# Altium footprint library Connectors.PcbLib: 67 footprints (part 3 of 5)
Each footprint in its own frame and in the unit in brackets; x right, y up, seen from the top. Pads: shape width x height; smd on the part's side, far side on the other; paste and mask are expansions set on the pad; w line width, h text height; cw(c..) or ccw(c..) is an arc to the next point about the centre after c.
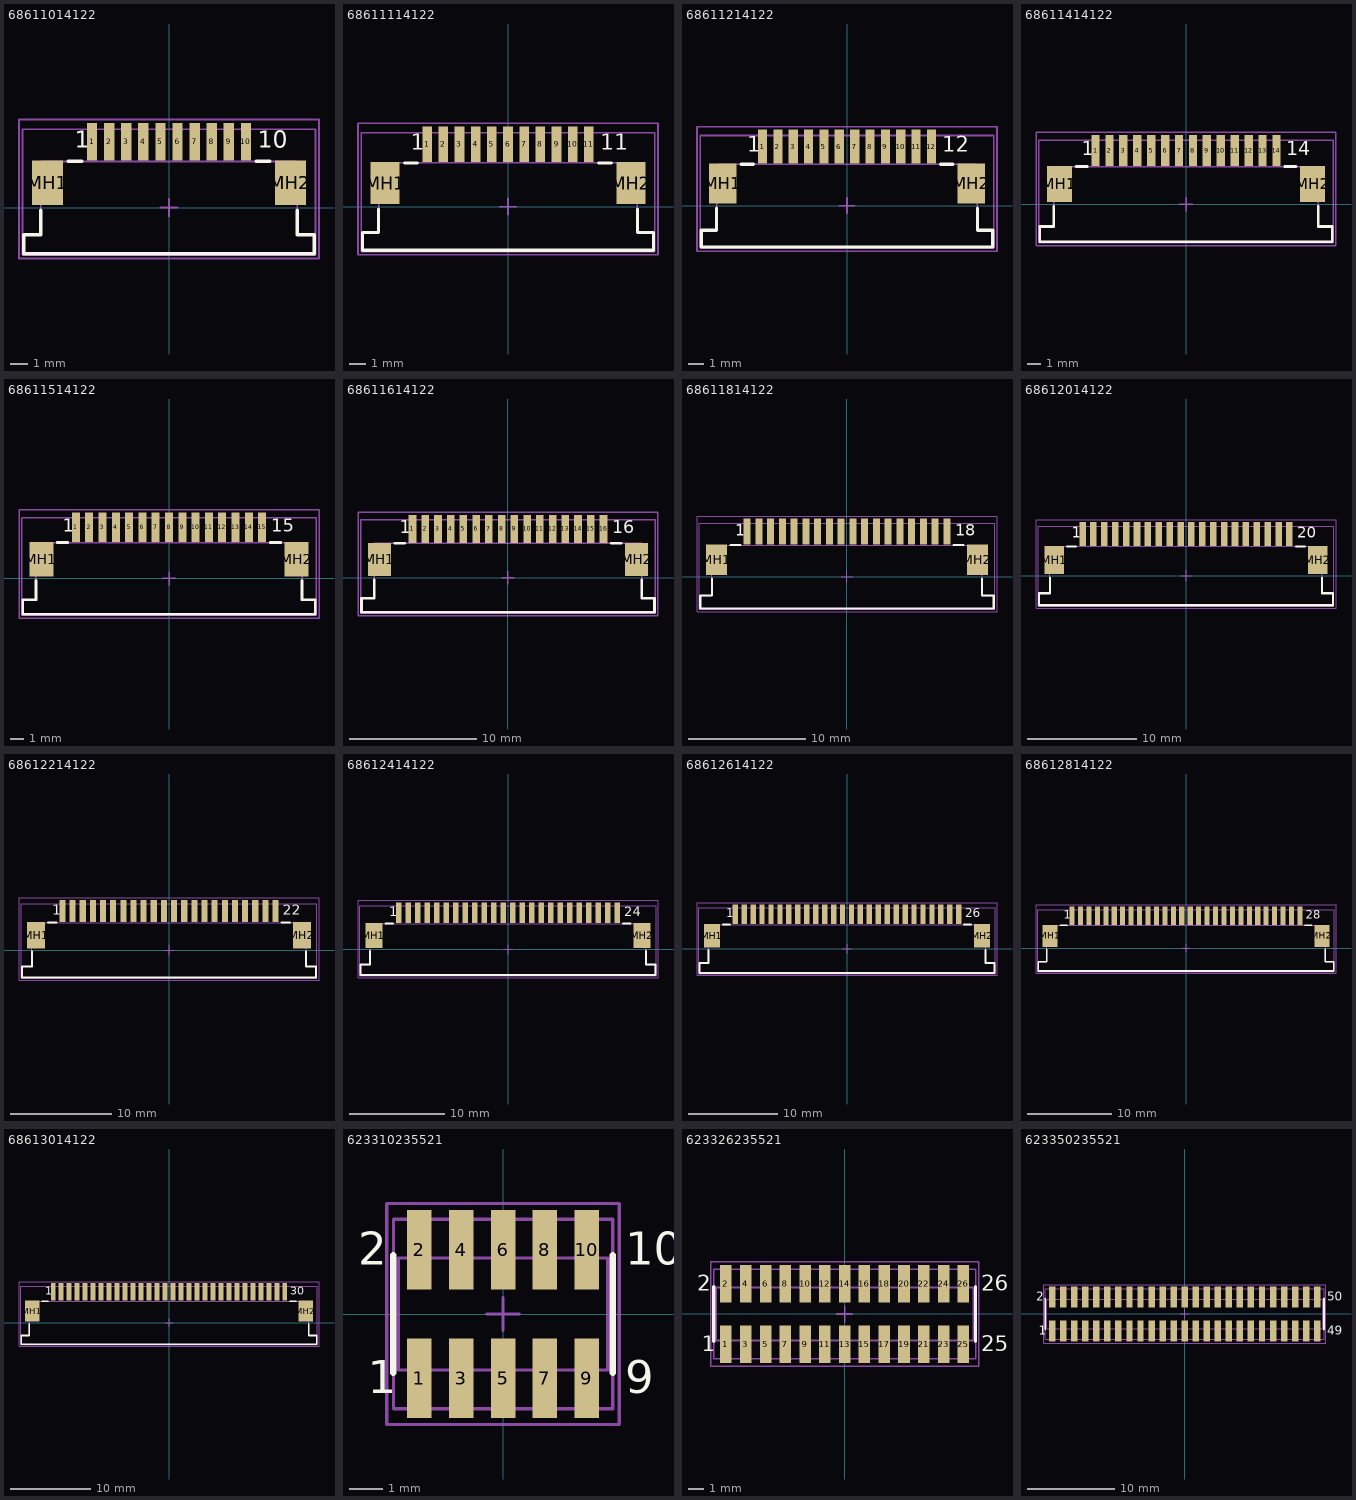
[diagram p2: the footprints below, top view; thin cyan lines are the x and y axes]

## 68611014122 [mm] "ZIF Connectors, Horizontal, Top Contact, pitch 1mm, 10p"
height 3.15
pads (12):
  rect 0.6x2.2 smd: 1(-4.5,3.85) 2(-3.5,3.85) 3(-2.5,3.85) 4(-1.5,3.85) 5(-0.5,3.85) 6(0.5,3.85) 7(1.5,3.85) 8(2.5,3.85) 9(3.5,3.85) 10(4.5,3.85)
  rect 1.8x2.6 smd: MH1(-7.1,1.45) MH2(7.1,1.45)
Top Overlay:
  lines w0.2: -7.5,-0.15 -7.5,-1.6 -8.5,-1.6 -8.5,-2.7 8.5,-2.7 8.5,-1.6 7.5,-1.6 7.5,-0.15 ; -5.9,2.7 -5.1,2.7 ; 5.1,2.7 5.9,2.7
  text "10" at 5.2,3.5 h1
  text "1" at -5.5,3.5 h1
Mechanical 11:
  lines w0.1: -8.5,-2.7 8.5,-2.7 8.5,-1.6 7.5,-1.6 7.5,2.7 -7.5,2.7 -7.5,-1.6 -8.5,-1.6 -8.5,-2.7
Mechanical 13:
  lines w0.1: -8.575,-2.775 -8.575,4.575 8.575,4.575 8.575,-2.775 -8.575,-2.775
Mechanical 15:
  lines w0.1: -0.5,0 0.5,0 ; 0,-0.5 0,0.5 ; -8.775,-2.975 8.775,-2.975 8.775,5.15 -8.775,5.15 -8.775,-2.975
3D body "68611014122.stp": height 3.02, standoff 0.02, extent -8.5,-2.7 8.5,4.4

## 68611114122 [mm] "ZIF Connectors, Horizontal, Top Contact, pitch 1mm, 11p"
height 3.15
pads (13):
  rect 0.6x2.2 smd: 1(-5,3.85) 2(-4,3.85) 3(-3,3.85) 4(-2,3.85) 5(-1,3.85) 6(0,3.85) 7(1,3.85) 8(2,3.85) 9(3,3.85) 10(4,3.85) 11(5,3.85)
  rect 1.8x2.6 smd: MH1(-7.6,1.45) MH2(7.6,1.45)
Top Overlay:
  lines w0.2: -8,-0.15 -8,-1.6 -9,-1.6 -9,-2.7 9,-2.7 9,-1.6 8,-1.6 8,-0.15 ; -6.4,2.7 -5.6,2.7 ; 5.6,2.7 6.4,2.7
  text "1" at -6,3.5 h1
  text "11" at 5.7,3.5 h1
Mechanical 11:
  lines w0.1: -9,-2.7 -9,-1.6 -8,-1.6 -8,2.7 8,2.7 8,-1.6 9,-1.6 9,-2.7 -9,-2.7
Mechanical 13:
  lines w0.1: -9.075,-2.775 9.075,-2.775 9.075,4.575 -9.075,4.575 -9.075,-2.775
Mechanical 15:
  lines w0.1: -0.5,0 0.5,0 ; 0,-0.5 0,0.5 ; -9.275,-2.975 -9.275,5.15 9.275,5.15 9.275,-2.975 -9.275,-2.975
3D body "68611114122.stp": height 3.02, standoff 0.02, extent -9,-2.7 9,4.4

## 68611214122 [mm] "ZIF Connectors, Horizontal, Top Contact, pitch 1mm, 12p"
height 3.15
pads (14):
  rect 0.6x2.2 smd: 1(-5.5,3.85) 2(-4.5,3.85) 3(-3.5,3.85) 4(-2.5,3.85) 5(-1.5,3.85) 6(-0.5,3.85) 7(0.5,3.85) 8(1.5,3.85) 9(2.5,3.85) 10(3.5,3.85) 11(4.5,3.85) 12(5.5,3.85)
  rect 1.8x2.6 smd: MH1(-8.1,1.45) MH2(8.1,1.45)
Top Overlay:
  lines w0.2: -8.5,-0.15 -8.5,-1.6 -9.5,-1.6 -9.5,-2.7 9.5,-2.7 9.5,-1.6 8.5,-1.6 8.5,-0.15 ; -6.9,2.7 -6.1,2.7 ; 6.1,2.7 6.9,2.7
  text "1" at -6.5,3.5 h1
  text "12" at 6.2,3.5 h1
Mechanical 11:
  lines w0.1: -9.5,-2.7 -9.5,-1.6 -8.5,-1.6 -8.5,2.7 8.5,2.7 8.5,-1.6 9.5,-1.6 9.5,-2.7 -9.5,-2.7
Mechanical 13:
  lines w0.1: -9.575,-2.775 9.575,-2.775 9.575,4.575 -9.575,4.575 -9.575,-2.775
Mechanical 15:
  lines w0.1: -0.5,0 0.5,0 ; 0,-0.5 0,0.5 ; -9.775,-2.975 -9.775,5.15 9.775,5.15 9.775,-2.975 -9.775,-2.975
3D body "68611214122.stp": height 3.02, standoff 0.02, extent -9.5,-2.7 9.5,4.4

## 68611414122 [mm] "ZIF Connectors, Horizontal, Top Contact, pitch 1mm, 14p"
height 3.15
pads (16):
  rect 0.6x2.2 smd: 1(-6.5,3.85) 2(-5.5,3.85) 3(-4.5,3.85) 4(-3.5,3.85) 5(-2.5,3.85) 6(-1.5,3.85) 7(-0.5,3.85) 8(0.5,3.85) 9(1.5,3.85) 10(2.5,3.85) 11(3.5,3.85) 12(4.5,3.85) 13(5.5,3.85) 14(6.5,3.85)
  rect 1.8x2.6 smd: MH1(-9.1,1.45) MH2(9.1,1.45)
Top Overlay:
  lines w0.2: -9.5,-0.15 -9.5,-1.6 -10.5,-1.6 -10.5,-2.7 10.5,-2.7 10.5,-1.6 9.5,-1.6 9.5,-0.15 ; -7.9,2.7 -7.1,2.7 ; 7.1,2.7 7.9,2.7
  text "1" at -7.5,3.5 h1
  text "14" at 7.2,3.5 h1
Mechanical 11:
  lines w0.1: -10.5,-2.7 -10.5,-1.6 -9.5,-1.6 -9.5,2.7 9.5,2.7 9.5,-1.6 10.5,-1.6 10.5,-2.7 -10.5,-2.7
Mechanical 13:
  lines w0.1: -10.575,-2.775 10.575,-2.775 10.575,4.575 -10.575,4.575 -10.575,-2.775
Mechanical 15:
  lines w0.1: -0.5,0 0.5,0 ; 0,-0.5 0,0.5 ; -10.775,-2.975 -10.775,5.15 10.775,5.15 10.775,-2.975 -10.775,-2.975
3D body "68611414122.stp": height 3.02, standoff 0.02, extent -10.5,-2.7 10.5,4.4

## 68611514122 [mm] "ZIF Connectors, Horizontal, Top Contact, pitch 1mm, 15p"
height 3.15
pads (17):
  rect 0.6x2.2 smd: 1(-7,3.85) 2(-6,3.85) 3(-5,3.85) 4(-4,3.85) 5(-3,3.85) 6(-2,3.85) 7(-1,3.85) 8(0,3.85) 9(1,3.85) 10(2,3.85) 11(3,3.85) 12(4,3.85) 13(5,3.85) 14(6,3.85) 15(7,3.85)
  rect 1.8x2.6 smd: MH1(-9.6,1.45) MH2(9.6,1.45)
Top Overlay:
  lines w0.2: -10,-0.15 -10,-1.6 -11,-1.6 -11,-2.7 11,-2.7 11,-1.6 10,-1.6 10,-0.15 ; -8.4,2.7 -7.6,2.7 ; 7.6,2.7 8.4,2.7
  text "15" at 7.7,3.5 h1
  text "1" at -8,3.5 h1
Mechanical 11:
  lines w0.1: -11,-2.7 -11,-1.6 -10,-1.6 -10,2.7 10,2.7 10,-1.6 11,-1.6 11,-2.7 -11,-2.7
Mechanical 13:
  lines w0.1: -11.075,-2.775 11.075,-2.775 11.075,4.575 -11.075,4.575 -11.075,-2.775
Mechanical 15:
  lines w0.1: -0.5,0 0.5,0 ; 0,-0.5 0,0.5 ; -11.275,-2.975 -11.275,5.15 11.275,5.15 11.275,-2.975 -11.275,-2.975
3D body "68611514122.stp": height 3.02, standoff 0.02, extent -11,-2.7 11,4.4

## 68611614122 [mm] "ZIF Connectors, Horizontal, Top Contact, pitch 1mm, 16p"
height 3.15
pads (18):
  rect 0.6x2.2 smd: 1(-7.5,3.85) 2(-6.5,3.85) 3(-5.5,3.85) 4(-4.5,3.85) 5(-3.5,3.85) 6(-2.5,3.85) 7(-1.5,3.85) 8(-0.5,3.85) 9(0.5,3.85) 10(1.5,3.85) 11(2.5,3.85) 12(3.5,3.85) 13(4.5,3.85) 14(5.5,3.85) 15(6.5,3.85) 16(7.5,3.85)
  rect 1.8x2.6 smd: MH1(-10.1,1.45) MH2(10.1,1.45)
Top Overlay:
  lines w0.2: -10.5,-0.15 -10.5,-1.6 -11.5,-1.6 -11.5,-2.7 11.5,-2.7 11.5,-1.6 10.5,-1.6 10.5,-0.15 ; -8.9,2.7 -8.1,2.7 ; 8.1,2.7 8.9,2.7
  text "1" at -8.5,3.5 h1
  text "16" at 8.2,3.5 h1
Mechanical 11:
  lines w0.1: -11.5,-2.7 -11.5,-1.6 -10.5,-1.6 -10.5,2.7 10.5,2.7 10.5,-1.6 11.5,-1.6 11.5,-2.7 -11.5,-2.7
Mechanical 13:
  lines w0.1: -11.575,-2.775 11.575,-2.775 11.575,4.575 -11.575,4.575 -11.575,-2.775
Mechanical 15:
  lines w0.1: -0.5,0 0.5,0 ; 0,-0.5 0,0.5 ; -11.775,-2.975 -11.775,5.15 11.775,5.15 11.775,-2.975 -11.775,-2.975
3D body "68611614122.stp": height 3.02, standoff 0.02, extent -11.5,-2.7 11.5,4.4

## 68611814122 [mm] "ZIF Connectors, Horizontal, Top Contact, pitch 1mm, 18p"
height 3.15
pads (20):
  rect 0.6x2.2 smd: 1(-8.5,3.85) 2(-7.5,3.85) 3(-6.5,3.85) 4(-5.5,3.85) 5(-4.5,3.85) 6(-3.5,3.85) 7(-2.5,3.85) 8(-1.5,3.85) 9(-0.5,3.85) 10(0.5,3.85) 11(1.5,3.85) 12(2.5,3.85) 13(3.5,3.85) 14(4.5,3.85) 15(5.5,3.85) 16(6.5,3.85) 17(7.5,3.85) 18(8.5,3.85)
  rect 1.8x2.6 smd: MH1(-11.1,1.45) MH2(11.1,1.45)
Top Overlay:
  lines w0.2: -11.5,-0.15 -11.5,-1.6 -12.5,-1.6 -12.5,-2.7 12.5,-2.7 12.5,-1.6 11.5,-1.6 11.5,-0.15 ; -9.9,2.7 -9.1,2.7 ; 9.1,2.7 9.9,2.7
  text "1" at -9.5,3.5 h1
  text "18" at 9.2,3.5 h1
Mechanical 11:
  lines w0.1: -12.5,-2.7 -12.5,-1.6 -11.5,-1.6 -11.5,2.7 11.5,2.7 11.5,-1.6 12.5,-1.6 12.5,-2.7 -12.5,-2.7
Mechanical 13:
  lines w0.1: -12.575,-2.775 12.575,-2.775 12.575,4.575 -12.575,4.575 -12.575,-2.775
Mechanical 15:
  lines w0.1: -0.5,0 0.5,0 ; 0,-0.5 0,0.5 ; -12.775,-2.975 -12.775,5.15 12.775,5.15 12.775,-2.975 -12.775,-2.975
3D body "68611814122.stp": height 3.02, standoff 0.02, extent -12.5,-2.7 12.5,4.4

## 68612014122 [mm] "ZIF Connectors, Horizontal, Top Contact, pitch 1mm, 20p"
height 3.15
pads (22):
  rect 0.6x2.2 smd: 1(-9.5,3.85) 2(-8.5,3.85) 3(-7.5,3.85) 4(-6.5,3.85) 5(-5.5,3.85) 6(-4.5,3.85) 7(-3.5,3.85) 8(-2.5,3.85) 9(-1.5,3.85) 10(-0.5,3.85) 11(0.5,3.85) 12(1.5,3.85) 13(2.5,3.85) 14(3.5,3.85) 15(4.5,3.85) 16(5.5,3.85) 17(6.5,3.85) 18(7.5,3.85) 19(8.5,3.85) 20(9.5,3.85)
  rect 1.8x2.6 smd: MH1(-12.1,1.45) MH2(12.1,1.45)
Top Overlay:
  lines w0.2: -12.5,-0.15 -12.5,-1.6 -13.5,-1.6 -13.5,-2.7 13.5,-2.7 13.5,-1.6 12.5,-1.6 12.5,-0.15 ; -10.9,2.7 -10.1,2.7 ; 10.1,2.7 10.9,2.7
  text "1" at -10.5,3.5 h1
  text "20" at 10.2,3.5 h1
Mechanical 11:
  lines w0.1: -13.5,-2.7 -13.5,-1.6 -12.5,-1.6 -12.5,2.7 12.5,2.7 12.5,-1.6 13.5,-1.6 13.5,-2.7 -13.5,-2.7
Mechanical 13:
  lines w0.1: -13.575,-2.775 13.575,-2.775 13.575,4.575 -13.575,4.575 -13.575,-2.775
Mechanical 15:
  lines w0.1: -0.5,0 0.5,0 ; 0,-0.5 0,0.5 ; -13.775,-2.975 -13.775,5.15 13.775,5.15 13.775,-2.975 -13.775,-2.975
3D body "68612014122.stp": height 3.02, standoff 0.02, extent -13.5,-2.7 13.5,4.4

## 68612214122 [mm] "ZIF Connectors, Horizontal, Top Contact, pitch 1mm, 22p"
height 3.15
pads (24):
  rect 0.6x2.2 smd: 1(-10.5,3.85) 2(-9.5,3.85) 3(-8.5,3.85) 4(-7.5,3.85) 5(-6.5,3.85) 6(-5.5,3.85) 7(-4.5,3.85) 8(-3.5,3.85) 9(-2.5,3.85) 10(-1.5,3.85) 11(-0.5,3.85) 12(0.5,3.85) 13(1.5,3.85) 14(2.5,3.85) 15(3.5,3.85) 16(4.5,3.85) 17(5.5,3.85) 18(6.5,3.85) 19(7.5,3.85) 20(8.5,3.85) 21(9.5,3.85) 22(10.5,3.85)
  rect 1.8x2.6 smd: MH1(-13.1,1.45) MH2(13.1,1.45)
Top Overlay:
  lines w0.2: -13.5,-0.15 -13.5,-1.6 -14.5,-1.6 -14.5,-2.7 14.5,-2.7 14.5,-1.6 13.5,-1.6 13.5,-0.15 ; -11.9,2.7 -11.1,2.7 ; 11.1,2.7 11.9,2.7
  text "1" at -11.5,3.5 h1
  text "22" at 11.2,3.5 h1
Mechanical 11:
  lines w0.1: -14.5,-2.7 -14.5,-1.6 -13.5,-1.6 -13.5,2.7 13.5,2.7 13.5,-1.6 14.5,-1.6 14.5,-2.7 -14.5,-2.7
Mechanical 13:
  lines w0.1: -14.575,-2.775 14.575,-2.775 14.575,4.575 -14.575,4.575 -14.575,-2.775
Mechanical 15:
  lines w0.1: -0.5,0 0.5,0 ; 0,-0.5 0,0.5 ; -14.775,-2.975 -14.775,5.15 14.775,5.15 14.775,-2.975 -14.775,-2.975
3D body "68612214122.stp": height 3.02, standoff 0.02, extent -14.5,-2.7 14.5,4.4

## 68612414122 [mm] "ZIF Connectors, Horizontal, Top Contact, pitch 1mm, 24p"
height 3.15
pads (26):
  rect 0.6x2.2 smd: 1(-11.5,3.85) 2(-10.5,3.85) 3(-9.5,3.85) 4(-8.5,3.85) 5(-7.5,3.85) 6(-6.5,3.85) 7(-5.5,3.85) 8(-4.5,3.85) 9(-3.5,3.85) 10(-2.5,3.85) 11(-1.5,3.85) 12(-0.5,3.85) 13(0.5,3.85) 14(1.5,3.85) 15(2.5,3.85) 16(3.5,3.85) 17(4.5,3.85) 18(5.5,3.85) 19(6.5,3.85) 20(7.5,3.85) 21(8.5,3.85) 22(9.5,3.85) 23(10.5,3.85) 24(11.5,3.85)
  rect 1.8x2.6 smd: MH1(-14.1,1.45) MH2(14.1,1.45)
Top Overlay:
  lines w0.2: -14.5,-0.15 -14.5,-1.6 -15.5,-1.6 -15.5,-2.7 15.5,-2.7 15.5,-1.6 14.5,-1.6 14.5,-0.15 ; -12.9,2.7 -12.1,2.7 ; 12.1,2.7 12.9,2.7
  text "24" at 12.2,3.5 h1
  text "1" at -12.5,3.5 h1
Mechanical 11:
  lines w0.1: -15.5,-2.7 15.5,-2.7 15.5,-1.6 14.5,-1.6 14.5,2.7 -14.5,2.7 -14.5,-1.6 -15.5,-1.6 -15.5,-2.7
Mechanical 13:
  lines w0.1: -15.575,-2.775 -15.575,4.575 15.575,4.575 15.575,-2.775 -15.575,-2.775
Mechanical 15:
  lines w0.1: -0.5,0 0.5,0 ; 0,-0.5 0,0.5 ; -15.775,-2.975 15.775,-2.975 15.775,5.15 -15.775,5.15 -15.775,-2.975
3D body "68612414122.stp": height 3.02, standoff 0.02, extent -15.5,-2.7 15.5,4.4

## 68612614122 [mm] "ZIF Connectors, Horizontal, Top Contact, pitch 1mm, 26p"
height 3.15
pads (28):
  rect 0.6x2.2 smd: 1(-12.5,3.85) 2(-11.5,3.85) 3(-10.5,3.85) 4(-9.5,3.85) 5(-8.5,3.85) 6(-7.5,3.85) 7(-6.5,3.85) 8(-5.5,3.85) 9(-4.5,3.85) 10(-3.5,3.85) 11(-2.5,3.85) 12(-1.5,3.85) 13(-0.5,3.85) 14(0.5,3.85) 15(1.5,3.85) 16(2.5,3.85) 17(3.5,3.85) 18(4.5,3.85) 19(5.5,3.85) 20(6.5,3.85) 21(7.5,3.85) 22(8.5,3.85) 23(9.5,3.85) 24(10.5,3.85) 25(11.5,3.85) 26(12.5,3.85)
  rect 1.8x2.6 smd: MH1(-15.1,1.45) MH2(15.1,1.45)
Top Overlay:
  lines w0.2: -15.5,-0.15 -15.5,-1.6 -16.5,-1.6 -16.5,-2.7 16.5,-2.7 16.5,-1.6 15.5,-1.6 15.5,-0.15 ; -13.9,2.7 -13.1,2.7 ; 13.1,2.7 13.9,2.7
  text "26" at 13.2,3.5 h1
  text "1" at -13.5,3.5 h1
Mechanical 11:
  lines w0.1: -16.5,-2.7 -16.5,-1.6 -15.5,-1.6 -15.5,2.7 15.5,2.7 15.5,-1.6 16.5,-1.6 16.5,-2.7 -16.5,-2.7
Mechanical 13:
  lines w0.1: -16.575,-2.775 16.575,-2.775 16.575,4.575 -16.575,4.575 -16.575,-2.775
Mechanical 15:
  lines w0.1: -0.5,0 0.5,0 ; 0,-0.5 0,0.5 ; -16.775,-2.975 -16.775,5.15 16.775,5.15 16.775,-2.975 -16.775,-2.975
3D body "68612614122.stp": height 3.02, standoff 0.02, extent -16.5,-2.7 16.5,4.4

## 68612814122 [mm] "ZIF Connectors, Horizontal, Top Contact, pitch 1mm, 28p"
height 3.15
pads (30):
  rect 0.6x2.2 smd: 1(-13.5,3.85) 2(-12.5,3.85) 3(-11.5,3.85) 4(-10.5,3.85) 5(-9.5,3.85) 6(-8.5,3.85) 7(-7.5,3.85) 8(-6.5,3.85) 9(-5.5,3.85) 10(-4.5,3.85) 11(-3.5,3.85) 12(-2.5,3.85) 13(-1.5,3.85) 14(-0.5,3.85) 15(0.5,3.85) 16(1.5,3.85) 17(2.5,3.85) 18(3.5,3.85) 19(4.5,3.85) 20(5.5,3.85) 21(6.5,3.85) 22(7.5,3.85) 23(8.5,3.85) 24(9.5,3.85) 25(10.5,3.85) 26(11.5,3.85) 27(12.5,3.85) 28(13.5,3.85)
  rect 1.8x2.6 smd: MH1(-16.1,1.45) MH2(16.1,1.45)
Top Overlay:
  lines w0.2: -16.5,-0.15 -16.5,-1.6 -17.5,-1.6 -17.5,-2.7 17.5,-2.7 17.5,-1.6 16.5,-1.6 16.5,-0.15 ; -14.9,2.7 -14.1,2.7 ; 14.1,2.7 14.9,2.7
  text "1" at -14.5,3.5 h1
  text "28" at 14.2,3.5 h1
Mechanical 11:
  lines w0.1: -17.5,-2.7 17.5,-2.7 17.5,-1.6 16.5,-1.6 16.5,2.7 -16.5,2.7 -16.5,-1.6 -17.5,-1.6 -17.5,-2.7
Mechanical 13:
  lines w0.1: -17.575,-2.775 -17.575,4.575 17.575,4.575 17.575,-2.775 -17.575,-2.775
Mechanical 15:
  lines w0.1: -0.5,0 0.5,0 ; 0,-0.5 0,0.5 ; -17.775,-2.975 17.775,-2.975 17.775,5.15 -17.775,5.15 -17.775,-2.975
3D body "68612814122.stp": height 3.02, standoff 0.02, extent -17.5,-2.7 17.5,4.4

## 68613014122 [mm] "ZIF Connectors, Horizontal, Top Contact, pitch 1mm, 30p"
height 3.15
pads (32):
  rect 0.6x2.2 smd: 1(-14.5,3.85) 2(-13.5,3.85) 3(-12.5,3.85) 4(-11.5,3.85) 5(-10.5,3.85) 6(-9.5,3.85) 7(-8.5,3.85) 8(-7.5,3.85) 9(-6.5,3.85) 10(-5.5,3.85) 11(-4.5,3.85) 12(-3.5,3.85) 13(-2.5,3.85) 14(-1.5,3.85) 15(-0.5,3.85) 16(0.5,3.85) 17(1.5,3.85) 18(2.5,3.85) 19(3.5,3.85) 20(4.5,3.85) 21(5.5,3.85) 22(6.5,3.85) 23(7.5,3.85) 24(8.5,3.85) 25(9.5,3.85) 26(10.5,3.85) 27(11.5,3.85) 28(12.5,3.85) 29(13.5,3.85) 30(14.5,3.85)
  rect 1.8x2.6 smd: MH1(-17.1,1.45) MH2(17.1,1.45)
Top Overlay:
  lines w0.2: -17.5,-0.15 -17.5,-1.6 -18.5,-1.6 -18.5,-2.7 18.5,-2.7 18.5,-1.6 17.5,-1.6 17.5,-0.15 ; -15.9,2.7 -15.1,2.7 ; 15.1,2.7 15.9,2.7
  text "30" at 15.2,3.5 h1
  text "1" at -15.5,3.5 h1
Mechanical 11:
  lines w0.1: -18.5,-2.7 -18.5,-1.6 -17.5,-1.6 -17.5,2.7 17.5,2.7 17.5,-1.6 18.5,-1.6 18.5,-2.7 -18.5,-2.7
Mechanical 13:
  lines w0.1: -18.575,-2.775 18.575,-2.775 18.575,4.575 -18.575,4.575 -18.575,-2.775
Mechanical 15:
  lines w0.1: -0.5,0 0.5,0 ; 0,-0.5 0,0.5 ; -18.775,-2.975 -18.775,5.15 18.775,5.15 18.775,-2.975 -18.775,-2.975
3D body "68613014122.stp": height 3.02, standoff 0.02, extent -18.5,-2.7 18.5,4.4

## 623310235521 [mm] "Pin Header, pitch 1.27 mm, SMD, Vertical, dual row, 10p"
height 4.45
pads (10):
  rect 0.74x2.4 smd: 1(-2.54,-1.95) 2(-2.54,1.95) 3(-1.27,-1.95) 4(-1.27,1.95) 5(0,-1.95) 6(0,1.95) 7(1.27,-1.95) 8(1.27,1.95) 9(2.54,-1.95) 10(2.54,1.95)
Top Overlay:
  lines w0.2: -3.325,-1.775 -3.325,1.775 ; 3.325,-1.775 3.325,1.775
  text "1" at -4.1,-2.4 h1
  text "2" at -4.4,1.5 h1
  text "9" at 3.7,-2.4 h1
  text "10" at 3.7,1.5 h1
Mechanical 11:
  lines w0.1: -3.175,-1.7 -3.175,1.7 3.175,1.7 3.175,-1.7 -3.175,-1.7
Mechanical 13:
  lines w0.1: -3.325,-2.875 -3.325,2.875 3.325,2.875 3.325,-2.875 -3.325,-2.875
Mechanical 15:
  lines w0.1: -0.5,0 0.5,0 ; 0,-0.5 0,0.5 ; -3.525,-3.35 -3.525,3.35 3.525,3.35 3.525,-3.35 -3.525,-3.35
3D body "623310235521.stp": height 6, standoff 0, extent -3.175,-2.75 3.175,2.75

## 623326235521 [mm] "Pin Header, pitch 1.27 mm, SMD, Vertical, dual row, 26p"
height 4.45
pads (26):
  rect 0.74x2.4 smd: 1(-7.62,-1.95) 2(-7.62,1.95) 3(-6.35,-1.95) 4(-6.35,1.95) 5(-5.08,-1.95) 6(-5.08,1.95) 7(-3.81,-1.95) 8(-3.81,1.95) 9(-2.54,-1.95) 10(-2.54,1.95) 11(-1.27,-1.95) 12(-1.27,1.95) 13(0,-1.95) 14(0,1.95) 15(1.27,-1.95) 16(1.27,1.95) 17(2.54,-1.95) 18(2.54,1.95) 19(3.81,-1.95) 20(3.81,1.95) 21(5.08,-1.95) 22(5.08,1.95) 23(6.35,-1.95) 24(6.35,1.95) 25(7.62,-1.95) 26(7.62,1.95)
Top Overlay:
  lines w0.2: -8.405,-1.775 -8.405,1.775 ; 8.405,-1.775 8.405,1.775
  text "1" at -9.18,-2.4 h1
  text "2" at -9.48,1.5 h1
  text "26" at 8.78,1.5 h1
  text "25" at 8.78,-2.4 h1
Mechanical 11:
  lines w0.1: -8.255,-1.7 -8.255,1.7 8.255,1.7 8.255,-1.7 -8.255,-1.7
Mechanical 13:
  lines w0.1: -8.405,-2.875 -8.405,2.875 8.405,2.875 8.405,-2.875 -8.405,-2.875
Mechanical 15:
  lines w0.1: -0.5,0 0.5,0 ; 0,-0.5 0,0.5 ; -8.605,-3.35 -8.605,3.35 8.605,3.35 8.605,-3.35 -8.605,-3.35
3D body "623326235521.stp": height 6, standoff 0, extent -8.255,-2.75 8.255,2.75

## 623350235521 [mm] "Pin Header, pitch 1.27 mm, SMD, Vertical, dual row, 50p"
height 4.45
pads (50):
  rect 0.74x2.4 smd: 1(-15.24,-1.95) 2(-15.24,1.95) 3(-13.97,-1.95) 4(-13.97,1.95) 5(-12.7,-1.95) 6(-12.7,1.95) 7(-11.43,-1.95) 8(-11.43,1.95) 9(-10.16,-1.95) 10(-10.16,1.95) 11(-8.89,-1.95) 12(-8.89,1.95) 13(-7.62,-1.95) 14(-7.62,1.95) 15(-6.35,-1.95) 16(-6.35,1.95) 17(-5.08,-1.95) 18(-5.08,1.95) 19(-3.81,-1.95) 20(-3.81,1.95) 21(-2.54,-1.95) 22(-2.54,1.95) 23(-1.27,-1.95) 24(-1.27,1.95) 25(0,-1.95) 26(0,1.95) 27(1.27,-1.95) 28(1.27,1.95) 29(2.54,-1.95) 30(2.54,1.95) 31(3.81,-1.95) 32(3.81,1.95) 33(5.08,-1.95) 34(5.08,1.95) 35(6.35,-1.95) 36(6.35,1.95) 37(7.62,-1.95) 38(7.62,1.95) 39(8.89,-1.95) 40(8.89,1.95) 41(10.16,-1.95) 42(10.16,1.95) 43(11.43,-1.95) 44(11.43,1.95) 45(12.7,-1.95) 46(12.7,1.95) 47(13.97,-1.95) 48(13.97,1.95) 49(15.24,-1.95) 50(15.24,1.95)
Top Overlay:
  lines w0.2: -16.025,-1.775 -16.025,1.775 ; 16.025,-1.775 16.025,1.775
  text "1" at -16.8,-2.4 h1
  text "2" at -17.1,1.5 h1
  text "49" at 16.4,-2.4 h1
  text "50" at 16.4,1.5 h1
Mechanical 11:
  lines w0.1: -15.875,-1.7 -15.875,1.7 15.875,1.7 15.875,-1.7 -15.875,-1.7
Mechanical 13:
  lines w0.1: -16.025,-2.875 -16.025,2.875 16.025,2.875 16.025,-2.875 -16.025,-2.875
Mechanical 15:
  lines w0.1: -0.5,0 0.5,0 ; 0,-0.5 0,0.5 ; -16.225,-3.35 -16.225,3.35 16.225,3.35 16.225,-3.35 -16.225,-3.35
3D body "623350235521.stp": height 6, standoff 0, extent -15.875,-2.75 15.875,2.75